# Altium footprint library Connectors SMD.PcbLib: 130 footprints (part 10 of 12) (continued)
## SAMTEC_SEAM-30-01-L-06-2-RA-TR [mm] "180 Contacts in 6 rows  (30 Pin per Row), Hi-Density Right Angle Open Pin Field Connector" (continued)
  round 1 hole 1.3 unplated mask+0.15: MEC1(-21.715,0) MEC2(21.715,0)
  round 1 hole 1.15 unplated mask+0.075: MEC3(-22.735,5.134) MEC4(-22.735,-2.616) MEC5(22.735,5.134) MEC6(22.735,-2.616)
Top Overlay:
  drawing of 197 lines, arcs and shapes, not listed
  text "6" at -18.353,7.72 h1.2
  text "180" at 16.177,7.62 h1.2
  text "175" at 16.177,-2.98 h1.2
  text "1" at -18.253,-3.08 h1.2
Mechanical 8:
  drawing of 1656 lines, arcs and shapes, not listed
Mechanical 14:
  drawing of 286 lines, arcs and shapes, not listed
  text "6" at -18.353,7.72 h1.2
  text "180" at 16.177,7.62 h1.2
  text "175" at 16.177,-2.98 h1.2
  text "1" at -18.253,-3.08 h1.2
Mechanical 15:
  lines w0.05: -24.888,-9.077 24.888,-9.077 24.888,7.298 22.529,7.298 22.484,8.568 20.238,8.568 20.194,7.298 -24.888,7.298 -24.888,-9.077
3D body: height 10.57, standoff -1.51, extent -24.638,-8.826 24.638,8.319

## SAMTEC_SEAM-30-03.0-L-06-2-A-K-TR [mm] "PISMO 2, VITA 57, VITA 57 Standard, 6 rows x 30 Columns, 180 contacts Male Connector"
height 6.6
pads (182):
  round 0.64 smd: 1(18.415,3.175) 2(18.415,1.905) 3(18.415,0.635) 4(18.415,-0.635) 5(18.415,-1.905) 6(18.415,-3.175) 7(17.145,3.175) 8(17.145,1.905) 9(17.145,0.635) 10(17.145,-0.635) 11(17.145,-1.905) 12(17.145,-3.175) 13(15.875,3.175) 14(15.875,1.905) 15(15.875,0.635) 16(15.875,-0.635) 17(15.875,-1.905) 18(15.875,-3.175) 19(14.605,3.175) 20(14.605,1.905) 21(14.605,0.635) 22(14.605,-0.635) 23(14.605,-1.905) 24(14.605,-3.175) 25(13.335,3.175) 26(13.335,1.905) 27(13.335,0.635) 28(13.335,-0.635) 29(13.335,-1.905) 30(13.335,-3.175) 31(12.065,3.175) 32(12.065,1.905) 33(12.065,0.635) 34(12.065,-0.635) 35(12.065,-1.905) 36(12.065,-3.175) 37(10.795,3.175) 38(10.795,1.905) 39(10.795,0.635) 40(10.795,-0.635) 41(10.795,-1.905) 42(10.795,-3.175) 43(9.525,3.175) 44(9.525,1.905) 45(9.525,0.635) 46(9.525,-0.635) 47(9.525,-1.905) 48(9.525,-3.175) 49(8.255,3.175) 50(8.255,1.905) 51(8.255,0.635) 52(8.255,-0.635) 53(8.255,-1.905) 54(8.255,-3.175) 55(6.985,3.175) 56(6.985,1.905) 57(6.985,0.635) 58(6.985,-0.635) 59(6.985,-1.905) 60(6.985,-3.175) 61(5.715,3.175) 62(5.715,1.905) 63(5.715,0.635) 64(5.715,-0.635) 65(5.715,-1.905) 66(5.715,-3.175) 67(4.445,3.175) 68(4.445,1.905) 69(4.445,0.635) 70(4.445,-0.635) 71(4.445,-1.905) 72(4.445,-3.175) 73(3.175,3.175) 74(3.175,1.905) 75(3.175,0.635) 76(3.175,-0.635) 77(3.175,-1.905) 78(3.175,-3.175) 79(1.905,3.175) 80(1.905,1.905) 81(1.905,0.635) 82(1.905,-0.635) 83(1.905,-1.905) 84(1.905,-3.175) 85(0.635,3.175) 86(0.635,1.905) 87(0.635,0.635) 88(0.635,-0.635) 89(0.635,-1.905) 90(0.635,-3.175) 91(-0.635,3.175) 92(-0.635,1.905) 93(-0.635,0.635) 94(-0.635,-0.635) 95(-0.635,-1.905) 96(-0.635,-3.175) 97(-1.905,3.175) 98(-1.905,1.905) 99(-1.905,0.635) 100(-1.905,-0.635) 101(-1.905,-1.905) 102(-1.905,-3.175) 103(-3.175,3.175) 104(-3.175,1.905) 105(-3.175,0.635) 106(-3.175,-0.635) 107(-3.175,-1.905) 108(-3.175,-3.175) 109(-4.445,3.175) 110(-4.445,1.905) 111(-4.445,0.635) 112(-4.445,-0.635) 113(-4.445,-1.905) 114(-4.445,-3.175) 115(-5.715,3.175) 116(-5.715,1.905) 117(-5.715,0.635) 118(-5.715,-0.635) 119(-5.715,-1.905) 120(-5.715,-3.175) 121(-6.985,3.175) 122(-6.985,1.905) 123(-6.985,0.635) 124(-6.985,-0.635) 125(-6.985,-1.905) 126(-6.985,-3.175) 127(-8.255,3.175) 128(-8.255,1.905) 129(-8.255,0.635) 130(-8.255,-0.635) 131(-8.255,-1.905) 132(-8.255,-3.175) 133(-9.525,3.175) 134(-9.525,1.905) 135(-9.525,0.635) 136(-9.525,-0.635) 137(-9.525,-1.905) 138(-9.525,-3.175) 139(-10.795,3.175) 140(-10.795,1.905) 141(-10.795,0.635) 142(-10.795,-0.635) 143(-10.795,-1.905) 144(-10.795,-3.175) 145(-12.065,3.175) 146(-12.065,1.905) 147(-12.065,0.635) 148(-12.065,-0.635) 149(-12.065,-1.905) 150(-12.065,-3.175) 151(-13.335,3.175) 152(-13.335,1.905) 153(-13.335,0.635) 154(-13.335,-0.635) 155(-13.335,-1.905) 156(-13.335,-3.175) 157(-14.605,3.175) 158(-14.605,1.905) 159(-14.605,0.635) 160(-14.605,-0.635) 161(-14.605,-1.905) 162(-14.605,-3.175) 163(-15.875,3.175) 164(-15.875,1.905) 165(-15.875,0.635) 166(-15.875,-0.635) 167(-15.875,-1.905) 168(-15.875,-3.175) 169(-17.145,3.175) 170(-17.145,1.905) 171(-17.145,0.635) 172(-17.145,-0.635) 173(-17.145,-1.905) 174(-17.145,-3.175) 175(-18.415,3.175) 176(-18.415,1.905) 177(-18.415,0.635) 178(-18.415,-0.635) 179(-18.415,-1.905) 180(-18.415,-3.175)
  round 1 hole 1.3 unplated mask+0.3: MEC1(-20.841,-3.05) MEC2(20.839,0)
Top Overlay:
  lines w0.2: -21.539,-3.672 -21.539,-4.039 -20.777,-4.801 -20.451,-4.801 ; -21.539,-2.428 -21.539,4.039 -20.777,4.801 20.777,4.801 21.539,4.039 21.539,0.62 ; -21.072,-2.144 -21.539,-1.676 -20.345,-1.676 ; -20.599,-1.676 -20.599,1.676 ; -20.548,-2.162 -20.382,-1.676 ; -20.382,1.676 -20.599,2.311 ; -20.382,3.2 -20.599,2.565 ; -20.345,-2.257 -20.345,3.2 ; -20.345,1.676 -21.539,1.676 -20.904,2.311 ; -20.345,2.946 -19.035,2.946 ; -19.918,-3.2 -19.035,-3.2 ; -19.912,-2.946 -19.035,-2.946 ; -19.035,-2.007 -20.066,-2.007 ; -19.035,-1.88 -19.939,-1.88 ; -19.035,-0.66 -19.939,-0.66 ; -19.035,-0.533 -20.066,-0.533 ; -19.035,0.533 -20.066,0.533 ; -19.035,0.66 -19.939,0.66 ; -19.035,1.88 -19.939,1.88 ; -19.035,2.007 -20.066,2.007 ; -19.035,3.2 -21.539,3.2 -20.904,2.565 ; -16.549,-4.801 20.777,-4.801 21.539,-4.039 21.539,-0.62 ; 19.035,-3.2 20.599,-3.2 ; 19.035,-2.946 20.345,-2.946 ; 19.035,-2.007 19.431,-2.007 ; 19.035,-1.88 19.304,-1.88 ; 19.035,-0.66 19.304,-0.66 ; 19.035,-0.533 19.431,-0.533 ; 19.035,0.533 19.431,0.533 ; 19.035,0.66 19.304,0.66 ; 19.035,1.88 19.304,1.88 ; 19.035,2.007 19.431,2.007 ; 19.035,2.946 20.345,2.946 ; 19.035,3.2 20.599,3.2 ; 20.345,-2.007 21.539,-2.007 20.904,-1.372 ; 20.345,-0.794 20.345,-2.946 ; 20.345,0.794 20.345,2.946 ; 20.345,2.007 21.539,2.007 20.904,1.372 ; 20.382,-2.007 20.599,-1.372 ; 20.382,2.007 20.599,1.372 ; 20.599,-2.007 20.599,-3.2 ; 20.599,-0.904 20.599,-1.372 ; 20.599,0.904 20.599,1.372 ; 20.599,2.007 20.599,3.2 ; 20.904,-0.933 20.904,-1.372 ; 20.904,0.933 20.904,1.372 ; 21.539,0.762 22.428,0.762 22.428,-0.762 21.54,-0.762 ; -20.904,2.311 -20.599,2.311 ; -20.904,2.311 -20.904,2.565 ; -20.904,2.565 -20.599,2.565 ; -20.599,2.311 -20.599,2.565 ; -20.066,-2.007 -20.066,-0.533 ; -20.066,-2.007 -19.939,-1.88 ; -20.066,-0.533 -19.939,-0.66 ; -20.066,0.533 -20.066,2.007 ; -20.066,0.533 -19.939,0.66 ; -20.066,2.007 -19.939,1.88 ; -19.939,-1.88 -19.939,-0.66 ; -19.939,0.66 -19.939,1.88 ; 19.304,-1.88 19.431,-2.007 ; 19.304,-1.88 19.304,-0.66 ; 19.304,-0.66 19.431,-0.533 ; 19.304,0.66 19.304,1.88 ; 19.304,0.66 19.431,0.533 ; 19.304,1.88 19.431,2.007 ; 19.431,-2.007 19.431,-0.533 ; 19.431,0.533 19.431,2.007 ; 20.345,-2.946 20.599,-3.2 ; 20.345,2.946 20.599,3.2 ; 20.599,-1.372 20.904,-1.372 ; 20.599,1.372 20.904,1.372
  text "1" at 18.919,3.935 h1
  text "180" at -19.74,-4.969 h1
Mechanical 8:
  drawing of 739 lines, arcs and shapes, not listed
Mechanical 14:
  lines w0.1: -20.599,-1.676 -20.599,1.676 ; -20.451,-4.801 -20.777,-4.801 -21.539,-4.039 -21.539,4.039 -20.777,4.801 20.777,4.801 21.539,4.039 21.539,-4.039 20.777,-4.801 -16.549,-4.801 ; -20.382,-3.2 -20.599,-2.565 ; -20.382,-1.676 -20.599,-2.311 ; -20.382,1.676 -20.599,2.311 ; -20.382,3.2 -20.599,2.565 ; -20.345,-3.2 -20.345,3.2 ; -20.345,-2.946 20.345,-2.946 ; -20.345,-1.676 -21.539,-1.676 -20.904,-2.311 ; -20.345,1.676 -21.539,1.676 -20.904,2.311 ; -20.345,2.946 20.345,2.946 ; -18.694,-3.2 -18.694,-3.251 -18.136,-3.251 -18.136,-3.2 ; -18.694,-1.88 -18.694,-1.829 -18.136,-1.829 -18.136,-1.88 ; -18.694,-0.66 -18.694,-0.711 -18.136,-0.711 -18.136,-0.66 ; -18.694,0.66 -18.694,0.711 -18.136,0.711 -18.136,0.66 ; -18.694,1.88 -18.694,1.829 -18.136,1.829 -18.136,1.88 ; -18.694,3.2 -18.694,3.251 -18.136,3.251 -18.136,3.2 ; 18.136,-3.2 18.136,-3.251 18.694,-3.251 18.694,-3.2 ; 18.136,-1.88 18.136,-1.829 18.694,-1.829 18.694,-1.88 ; 18.136,-0.66 18.136,-0.711 18.694,-0.711 18.694,-0.66 ; 18.136,0.66 18.136,0.711 18.694,0.711 18.694,0.66 ; 18.136,1.88 18.136,1.829 18.694,1.829 18.694,1.88 ; 18.136,3.2 18.136,3.251 18.694,3.251 18.694,3.2 ; 20.345,-2.007 21.539,-2.007 20.904,-1.372 ; 20.345,2.007 21.539,2.007 20.904,1.372 ; 20.382,-2.007 20.599,-1.372 ; 20.382,2.007 20.599,1.372 ; 20.599,-2.007 20.599,-3.2 ; 20.599,2.007 20.599,3.2 ; 21.539,0.762 22.428,0.762 22.428,-0.762 21.54,-0.762 ; -20.904,-2.565 -20.904,-2.311 ; -20.904,-2.565 -20.599,-2.565 ; -20.904,-2.565 -21.539,-3.2 20.599,-3.2 ; -20.904,-2.311 -20.599,-2.311 ; -20.904,2.311 -20.599,2.311 ; -20.904,2.311 -20.904,2.565 ; -20.904,2.565 -21.539,3.2 20.599,3.2 ; -20.904,2.565 -20.599,2.565 ; -20.599,-2.565 -20.599,-2.311 ; -20.599,2.311 -20.599,2.565 ; -20.066,-2.007 19.431,-2.007 ; -20.066,-2.007 -20.066,-0.533 ; -20.066,-2.007 -19.939,-1.88 ; -20.066,-0.533 19.431,-0.533 ; -20.066,-0.533 -19.939,-0.66 ; -20.066,0.533 19.431,0.533 ; -20.066,0.533 -20.066,2.007 ; -20.066,0.533 -19.939,0.66 ; -20.066,2.007 19.431,2.007 ; -20.066,2.007 -19.939,1.88 ; -19.939,-1.88 -19.939,-0.66 ; -19.939,-1.88 19.304,-1.88 ; -19.939,-0.66 19.304,-0.66 ; -19.939,0.66 19.304,0.66 ; -19.939,0.66 -19.939,1.88 ; -19.939,1.88 19.304,1.88 ; 19.304,-1.88 19.431,-2.007 ; 19.304,-1.88 19.304,-0.66 ; 19.304,-0.66 19.431,-0.533 ; 19.304,0.66 19.304,1.88 ; 19.304,0.66 19.431,0.533 ; 19.304,1.88 19.431,2.007 ; 19.431,-2.007 19.431,-0.533 ; 19.431,0.533 19.431,2.007 ; 20.345,-2.946 20.345,2.946 ; 20.345,-2.946 20.599,-3.2 ; 20.345,2.946 20.599,3.2 ; 20.599,-1.372 20.904,-1.372 ; 20.599,-1.372 20.599,1.372 ; 20.599,1.372 20.904,1.372 ; 20.904,-1.372 20.904,1.372
  text "1" at 18.919,3.935 h1
  text "180" at -19.74,-4.969 h1
Mechanical 15:
  lines w0.05: -21.79,-5.05 -21.79,5.05 21.79,5.05 21.79,1.012 22.678,1.012 22.678,-1.012 21.79,-1.012 21.79,-5.05 -21.79,-5.05
3D body: height 6.6, standoff -1.27, extent -21.539,-4.8 22.428,4.801

## SAMTEC_SFM-105-02-S-D-APTR [mm] "10 Contacts - Pitch 1.27mm - Top Entry, Dual Row Surface Mount Receptacle With Alignment Pin"
height 4.75
pads (12):
  rect 0.73x2.2 smd: 1(-2.54,1.365) 2(-2.54,-1.365) 3(-1.27,1.365) 4(-1.27,-1.365) 5(0,1.365) 6(0,-1.365) 7(1.27,1.365) 8(1.27,-1.365) 9(2.54,1.365) 10(2.54,-1.365)
  round 1 hole 1.4 unplated mask+0.2: MEC1(-4.13,0) MEC2(4.13,0)
Top Overlay:
  circle w0.25: c-3.592,2.35 r0.125
  circle w0.25: c-3.592,2.35 r0.125
  lines w0.2: -3.366,-0.564 -3.366,-1.524 -3.31,-1.524 ; -3.366,0.564 -3.366,1.524 -3.31,1.524 ; 3.31,-2.159 3.365,-2.159 3.365,-1.524 ; 3.31,-1.524 3.365,-1.524 ; 3.31,1.524 3.365,1.524 3.365,0.564 ; 3.365,-0.564 3.365,-1.524
Mechanical 8:
  lines w0.1: -4.63,0 -4.13,0 ; -4.13,-0.5 -4.13,0 ; -4.13,0.5 -4.13,0 ; -3.63,0 -4.13,0 ; -3.04,-1.365 -2.54,-1.365 ; -3.04,1.365 -2.54,1.365 ; -2.54,-1.865 -2.54,-1.365 ; -2.54,-0.865 -2.54,-1.365 ; -2.54,0.865 -2.54,1.365 ; -2.54,1.865 -2.54,1.365 ; -2.04,-1.365 -2.54,-1.365 ; -2.04,1.365 -2.54,1.365 ; -1.77,-1.365 -1.27,-1.365 ; -1.77,1.365 -1.27,1.365 ; -1.27,-1.865 -1.27,-1.365 ; -1.27,-0.865 -1.27,-1.365 ; -1.27,0.865 -1.27,1.365 ; -1.27,1.865 -1.27,1.365 ; -0.77,-1.365 -1.27,-1.365 ; -0.77,1.365 -1.27,1.365 ; -0.5,-1.365 0,-1.365 ; -0.5,0 0,0 ; -0.5,1.365 0,1.365 ; 0,-1.865 0,-1.365 ; 0,-0.865 0,-1.365 ; 0,-0.5 0,0 ; 0,0.5 0,0 ; 0,0.865 0,1.365 ; 0,1.865 0,1.365 ; 0.5,-1.365 0,-1.365 ; 0.5,0 0,0 ; 0.5,1.365 0,1.365 ; 0.77,-1.365 1.27,-1.365 ; 0.77,1.365 1.27,1.365 ; 1.27,-1.865 1.27,-1.365 ; 1.27,-0.865 1.27,-1.365 ; 1.27,0.865 1.27,1.365 ; 1.27,1.865 1.27,1.365 ; 1.77,-1.365 1.27,-1.365 ; 1.77,1.365 1.27,1.365 ; 2.04,-1.365 2.54,-1.365 ; 2.04,1.365 2.54,1.365 ; 2.54,-1.865 2.54,-1.365 ; 2.54,-0.865 2.54,-1.365 ; 2.54,0.865 2.54,1.365 ; 2.54,1.865 2.54,1.365 ; 3.04,-1.365 2.54,-1.365 ; 3.04,1.365 2.54,1.365 ; 3.63,0 4.13,0 ; 4.13,-0.5 4.13,0 ; 4.13,0.5 4.13,0 ; 4.63,0 4.13,0 ; -2.91,-2.475 -2.17,-2.475 -2.17,-0.254 -2.91,-0.254 -2.91,-2.475 ; -2.91,0.254 -2.91,2.475 -2.17,2.475 -2.17,0.254 -2.91,0.254 ; -1.64,-2.475 -0.9,-2.475 -0.9,-0.254 -1.64,-0.254 -1.64,-2.475 ; -1.64,0.254 -1.64,2.475 -0.9,2.475 -0.9,0.254 -1.64,0.254 ; -0.37,-2.475 0.37,-2.475 0.37,-0.254 -0.37,-0.254 -0.37,-2.475 ; -0.37,0.254 -0.37,2.475 0.37,2.475 0.37,0.254 -0.37,0.254 ; 0.9,-2.475 1.64,-2.475 1.64,-0.254 0.9,-0.254 0.9,-2.475 ; 0.9,0.254 0.9,2.475 1.64,2.475 1.64,0.254 0.9,0.254 ; 2.17,-2.475 2.91,-2.475 2.91,-0.254 2.17,-0.254 2.17,-2.475 ; 2.17,0.254 2.17,2.475 2.91,2.475 2.91,0.254 2.17,0.254
Mechanical 14:
  lines w0.1: -3.366,-0.635 -4.763,-0.635 -4.763,0.635 -3.366,0.635 ; 1.333,-1.524 1.333,-2.159 3.366,-2.159 3.366,1.524 -3.366,1.524 -3.366,-1.524 3.366,-1.524 ; 3.366,-0.635 4.763,-0.635 4.763,0.635 3.366,0.635 ; -3.048,-1.143 -3.048,-0.127 ; -3.048,-1.143 -2.032,-1.143 ; -3.048,-1.143 -2.819,-0.914 ; -3.048,-0.127 -2.032,-0.127 ; -3.048,-0.127 -2.819,-0.356 ; -3.048,0.127 -3.048,1.143 ; -3.048,0.127 -2.032,0.127 ; -3.048,0.127 -2.819,0.356 ; -3.048,1.143 -2.032,1.143 ; -3.048,1.143 -2.819,0.914 ; -2.819,-0.914 -2.819,-0.356 ; -2.819,-0.914 -2.261,-0.914 ; -2.819,-0.356 -2.261,-0.356 ; -2.819,0.356 -2.819,0.914 ; -2.819,0.356 -2.261,0.356 ; -2.819,0.914 -2.261,0.914 ; -2.261,-0.914 -2.032,-1.143 ; -2.261,-0.914 -2.261,-0.356 ; -2.261,-0.356 -2.032,-0.127 ; -2.261,0.356 -2.032,0.127 ; -2.261,0.356 -2.261,0.914 ; -2.261,0.914 -2.032,1.143 ; -2.032,-1.143 -2.032,-0.127 ; -2.032,0.127 -2.032,1.143 ; -1.778,-1.143 -1.778,-0.127 ; -1.778,-1.143 -0.762,-1.143 ; -1.778,-1.143 -1.549,-0.914 ; -1.778,-0.127 -0.762,-0.127 ; -1.778,-0.127 -1.549,-0.356 ; -1.778,0.127 -1.778,1.143 ; -1.778,0.127 -0.762,0.127 ; -1.778,0.127 -1.549,0.356 ; -1.778,1.143 -0.762,1.143 ; -1.778,1.143 -1.549,0.914 ; -1.549,-0.914 -1.549,-0.356 ; -1.549,-0.914 -0.991,-0.914 ; -1.549,-0.356 -0.991,-0.356 ; -1.549,0.356 -1.549,0.914 ; -1.549,0.356 -0.991,0.356 ; -1.549,0.914 -0.991,0.914 ; -0.991,-0.914 -0.762,-1.143 ; -0.991,-0.914 -0.991,-0.356 ; -0.991,-0.356 -0.762,-0.127 ; -0.991,0.356 -0.762,0.127 ; -0.991,0.356 -0.991,0.914 ; -0.991,0.914 -0.762,1.143 ; -0.762,-1.143 -0.762,-0.127 ; -0.762,0.127 -0.762,1.143 ; -0.508,-1.143 -0.508,-0.127 ; -0.508,-1.143 0.508,-1.143 ; -0.508,-1.143 -0.279,-0.914 ; -0.508,-0.127 0.508,-0.127 ; -0.508,-0.127 -0.279,-0.356 ; -0.508,0.127 -0.508,1.143 ; -0.508,0.127 0.508,0.127 ; -0.508,0.127 -0.279,0.356 ; -0.508,1.143 0.508,1.143 ; -0.508,1.143 -0.279,0.914 ; -0.279,-0.914 -0.279,-0.356 ; -0.279,-0.914 0.279,-0.914 ; -0.279,-0.356 0.279,-0.356 ; -0.279,0.356 -0.279,0.914 ; -0.279,0.356 0.279,0.356 ; -0.279,0.914 0.279,0.914 ; 0.279,-0.914 0.508,-1.143 ; 0.279,-0.914 0.279,-0.356 ; 0.279,-0.356 0.508,-0.127 ; 0.279,0.356 0.508,0.127 ; 0.279,0.356 0.279,0.914 ; 0.279,0.914 0.508,1.143 ; 0.508,-1.143 0.508,-0.127 ; 0.508,0.127 0.508,1.143 ; 0.762,-1.143 0.762,-0.127 ; 0.762,-1.143 1.778,-1.143 ; 0.762,-1.143 0.991,-0.914 ; 0.762,-0.127 1.778,-0.127 ; 0.762,-0.127 0.991,-0.356 ; 0.762,0.127 0.762,1.143 ; 0.762,0.127 1.778,0.127 ; 0.762,0.127 0.991,0.356 ; 0.762,1.143 1.778,1.143 ; 0.762,1.143 0.991,0.914 ; 0.991,-0.914 0.991,-0.356 ; 0.991,-0.914 1.549,-0.914 ; 0.991,-0.356 1.549,-0.356 ; 0.991,0.356 0.991,0.914 ; 0.991,0.356 1.549,0.356 ; 0.991,0.914 1.549,0.914 ; 1.549,-0.914 1.778,-1.143 ; 1.549,-0.914 1.549,-0.356 ; 1.549,-0.356 1.778,-0.127 ; 1.549,0.356 1.778,0.127 ; 1.549,0.356 1.549,0.914 ; 1.549,0.914 1.778,1.143 ; 1.778,-1.143 1.778,-0.127 ; 1.778,0.127 1.778,1.143 ; 2.032,-1.143 2.032,-0.127 ; 2.032,-1.143 3.048,-1.143 ; 2.032,-1.143 2.261,-0.914 ; 2.032,-0.127 3.048,-0.127 ; 2.032,-0.127 2.261,-0.356 ; 2.032,0.127 2.032,1.143 ; 2.032,0.127 3.048,0.127 ; 2.032,0.127 2.261,0.356 ; 2.032,1.143 3.048,1.143 ; 2.032,1.143 2.261,0.914 ; 2.261,-0.914 2.261,-0.356 ; 2.261,-0.914 2.819,-0.914 ; 2.261,-0.356 2.819,-0.356 ; 2.261,0.356 2.261,0.914 ; 2.261,0.356 2.819,0.356 ; 2.261,0.914 2.819,0.914 ; 2.819,-0.914 3.048,-1.143 ; 2.819,-0.914 2.819,-0.356 ; 2.819,-0.356 3.048,-0.127 ; 2.819,0.356 3.048,0.127 ; 2.819,0.356 2.819,0.914 ; 2.819,0.914 3.048,1.143 ; 3.048,-1.143 3.048,-0.127 ; 3.048,0.127 3.048,1.143
Mechanical 15:
  lines w0.05: -5.013,-2.725 -5.013,2.725 5.013,2.725 5.013,-2.725 -5.013,-2.725
3D body: height 4.7, standoff -1.14, extent -4.765,-2.159 4.765,2.096

## SAMTEC_SFM-125-02-S-D-APTR [mm] "50 Contacts - Pitch 1.27mm - Top Entry, Dual Row Surface Mount Receptacle With Alignment Pin"
height 4.75
pads (52):
  rect 0.73x2.2 smd: 1(-15.24,1.365) 2(-15.24,-1.365) 3(-13.97,1.365) 4(-13.97,-1.365) 5(-12.7,1.365) 6(-12.7,-1.365) 7(-11.43,1.365) 8(-11.43,-1.365) 9(-10.16,1.365) 10(-10.16,-1.365) 11(-8.89,1.365) 12(-8.89,-1.365) 13(-7.62,1.365) 14(-7.62,-1.365) 15(-6.35,1.365) 16(-6.35,-1.365) 17(-5.08,1.365) 18(-5.08,-1.365) 19(-3.81,1.365) 20(-3.81,-1.365) 21(-2.54,1.365) 22(-2.54,-1.365) 23(-1.27,1.365) 24(-1.27,-1.365) 25(0,1.365) 26(0,-1.365) 27(1.27,1.365) 28(1.27,-1.365) 29(2.54,1.365) 30(2.54,-1.365) 31(3.81,1.365) 32(3.81,-1.365) 33(5.08,1.365) 34(5.08,-1.365) 35(6.35,1.365) 36(6.35,-1.365) 37(7.62,1.365) 38(7.62,-1.365) 39(8.89,1.365) 40(8.89,-1.365) 41(10.16,1.365) 42(10.16,-1.365) 43(11.43,1.365) 44(11.43,-1.365) 45(12.7,1.365) 46(12.7,-1.365) 47(13.97,1.365) 48(13.97,-1.365) 49(15.24,1.365) 50(15.24,-1.365)
  round 1 hole 1.4 unplated mask+0.2: MEC1(-16.83,0) MEC2(16.83,0)
Top Overlay:
  circle w0.25: c-16.292,2.35 r0.125
  circle w0.25: c-16.292,2.35 r0.125
  lines w0.2: -16.066,-0.564 -16.066,-1.524 -16.01,-1.524 ; -16.066,0.564 -16.066,1.524 -16.01,1.524 ; 16.01,-2.159 16.066,-2.159 16.066,-1.524 ; 16.01,-1.524 16.066,-1.524 ; 16.01,1.524 16.066,1.524 16.066,0.564 ; 16.066,-0.564 16.066,-1.524
Mechanical 8:
  drawing of 412 lines, arcs and shapes, not listed
Mechanical 14:
  drawing of 614 lines, arcs and shapes, not listed
Mechanical 15:
  lines w0.05: -17.713,-2.725 -17.713,2.725 17.713,2.725 17.713,-2.725 -17.713,-2.725
3D body: height 4.7, standoff -1.14, extent -17.465,-2.159 17.465,2.096

## SAMTEC_SFM-130-02-S-D-A [mm] "60 Contacts - Pitch 1.27mm - Top Entry, Dual Row Surface Mount Receptacle With Alignment Pin"
height 4.75
pads (62):
  rect 0.73x2.2 smd: 1(-18.415,1.365) 2(-18.415,-1.365) 3(-17.145,1.365) 4(-17.145,-1.365) 5(-15.875,1.365) 6(-15.875,-1.365) 7(-14.605,1.365) 8(-14.605,-1.365) 9(-13.335,1.365) 10(-13.335,-1.365) 11(-12.065,1.365) 12(-12.065,-1.365) 13(-10.795,1.365) 14(-10.795,-1.365) 15(-9.525,1.365) 16(-9.525,-1.365) 17(-8.255,1.365) 18(-8.255,-1.365) 19(-6.985,1.365) 20(-6.985,-1.365) 21(-5.715,1.365) 22(-5.715,-1.365) 23(-4.445,1.365) 24(-4.445,-1.365) 25(-3.175,1.365) 26(-3.175,-1.365) 27(-1.905,1.365) 28(-1.905,-1.365) 29(-0.635,1.365) 30(-0.635,-1.365) 31(0.635,1.365) 32(0.635,-1.365) 33(1.905,1.365) 34(1.905,-1.365) 35(3.175,1.365) 36(3.175,-1.365) 37(4.445,1.365) 38(4.445,-1.365) 39(5.715,1.365) 40(5.715,-1.365) 41(6.985,1.365) 42(6.985,-1.365) 43(8.255,1.365) 44(8.255,-1.365) 45(9.525,1.365) 46(9.525,-1.365) 47(10.795,1.365) 48(10.795,-1.365) 49(12.065,1.365) 50(12.065,-1.365) 51(13.335,1.365) 52(13.335,-1.365) 53(14.605,1.365) 54(14.605,-1.365) 55(15.875,1.365) 56(15.875,-1.365) 57(17.145,1.365) 58(17.145,-1.365) 59(18.415,1.365) 60(18.415,-1.365)
  round 1 hole 1.4 unplated mask+0.2: MEC1(-20,0) MEC2(20,0)
Top Overlay:
  circle w0.25: c-19.467,2.35 r0.125
  circle w0.25: c-19.467,2.35 r0.125
  lines w0.2: -19.236,-0.564 -19.236,-1.524 -19.18,-1.524 ; -19.236,0.564 -19.236,1.524 -19.18,1.524 ; 19.18,-2.159 19.236,-2.159 19.236,-1.524 ; 19.18,-1.524 19.236,-1.524 ; 19.18,1.524 19.236,1.524 19.236,0.564 ; 19.236,-0.564 19.236,-1.524
Mechanical 8:
  drawing of 209 lines, arcs and shapes, not listed
Mechanical 14:
  drawing of 741 lines, arcs and shapes, not listed
Mechanical 15:
  lines w0.1: -20.888,-2.725 -20.888,2.725 20.888,2.725 20.888,-2.725 -20.888,-2.725
3D body: height 4.7, standoff -1.14, extent -20.637,-2.159 20.638,2.096

## SAMTEC_SFML-130-T2-S-D-A [mm] "60 Contacts - Pitch 1.27mm - Top Entry, Dual Row Surface Mount Receptacle With Alignment Pin And Locking Tab"
height 4.57
pads (62):
  rect 0.73x2.2 smd: 1(-18.415,1.365) 2(-18.415,-1.365) 3(-17.145,1.365) 4(-17.145,-1.365) 5(-15.875,1.365) 6(-15.875,-1.365) 7(-14.605,1.365) 8(-14.605,-1.365) 9(-13.335,1.365) 10(-13.335,-1.365) 11(-12.065,1.365) 12(-12.065,-1.365) 13(-10.795,1.365) 14(-10.795,-1.365) 15(-9.525,1.365) 16(-9.525,-1.365) 17(-8.255,1.365) 18(-8.255,-1.365) 19(-6.985,1.365) 20(-6.985,-1.365) 21(-5.715,1.365) 22(-5.715,-1.365) 23(-4.445,1.365) 24(-4.445,-1.365) 25(-3.175,1.365) 26(-3.175,-1.365) 27(-1.905,1.365) 28(-1.905,-1.365) 29(-0.635,1.365) 30(-0.635,-1.365) 31(0.635,1.365) 32(0.635,-1.365) 33(1.905,1.365) 34(1.905,-1.365) 35(3.175,1.365) 36(3.175,-1.365) 37(4.445,1.365) 38(4.445,-1.365) 39(5.715,1.365) 40(5.715,-1.365) 41(6.985,1.365) 42(6.985,-1.365) 43(8.255,1.365) 44(8.255,-1.365) 45(9.525,1.365) 46(9.525,-1.365) 47(10.795,1.365) 48(10.795,-1.365) 49(12.065,1.365) 50(12.065,-1.365) 51(13.335,1.365) 52(13.335,-1.365) 53(14.605,1.365) 54(14.605,-1.365) 55(15.875,1.365) 56(15.875,-1.365) 57(17.145,1.365) 58(17.145,-1.365) 59(18.415,1.365) 60(18.415,-1.365)
  round 1 hole 1.4 unplated mask+0.2: MEC1(-20,0) MEC2(20,0)
Top Overlay:
  circle w0.25: c-19.467,2.35 r0.125
  circle w0.25: c-19.467,2.35 r0.125
  lines w0.2: -19.236,-0.564 -19.236,-1.524 -19.18,-1.524 ; -19.236,0.564 -19.236,1.524 -19.18,1.524 ; 19.18,-2.159 19.236,-2.159 19.236,-1.524 ; 19.18,-1.524 19.236,-1.524 ; 19.18,1.524 19.236,1.524 19.236,0.564 ; 19.236,-0.564 19.236,-1.524
Mechanical 8:
  drawing of 209 lines, arcs and shapes, not listed
Mechanical 14:
  drawing of 746 lines, arcs and shapes, not listed
Mechanical 15:
  lines w0.1: -20.888,-2.725 20.888,-2.725 20.888,2.725 -20.888,2.725 -20.888,-2.725
3D body: height 4.7, standoff -1.14, extent -20.637,-2.21 20.638,2.096